# Altium footprint library HamedLib.PcbLib: 221 footprints (part 12 of 14)
Each footprint in its own frame and in the unit in brackets; x right, y up, seen from the top. Pads: shape width x height; smd on the part's side, far side on the other; paste and mask are expansions set on the pad; w line width, h text height; cw(c..) or ccw(c..) is an arc to the next point about the centre after c.
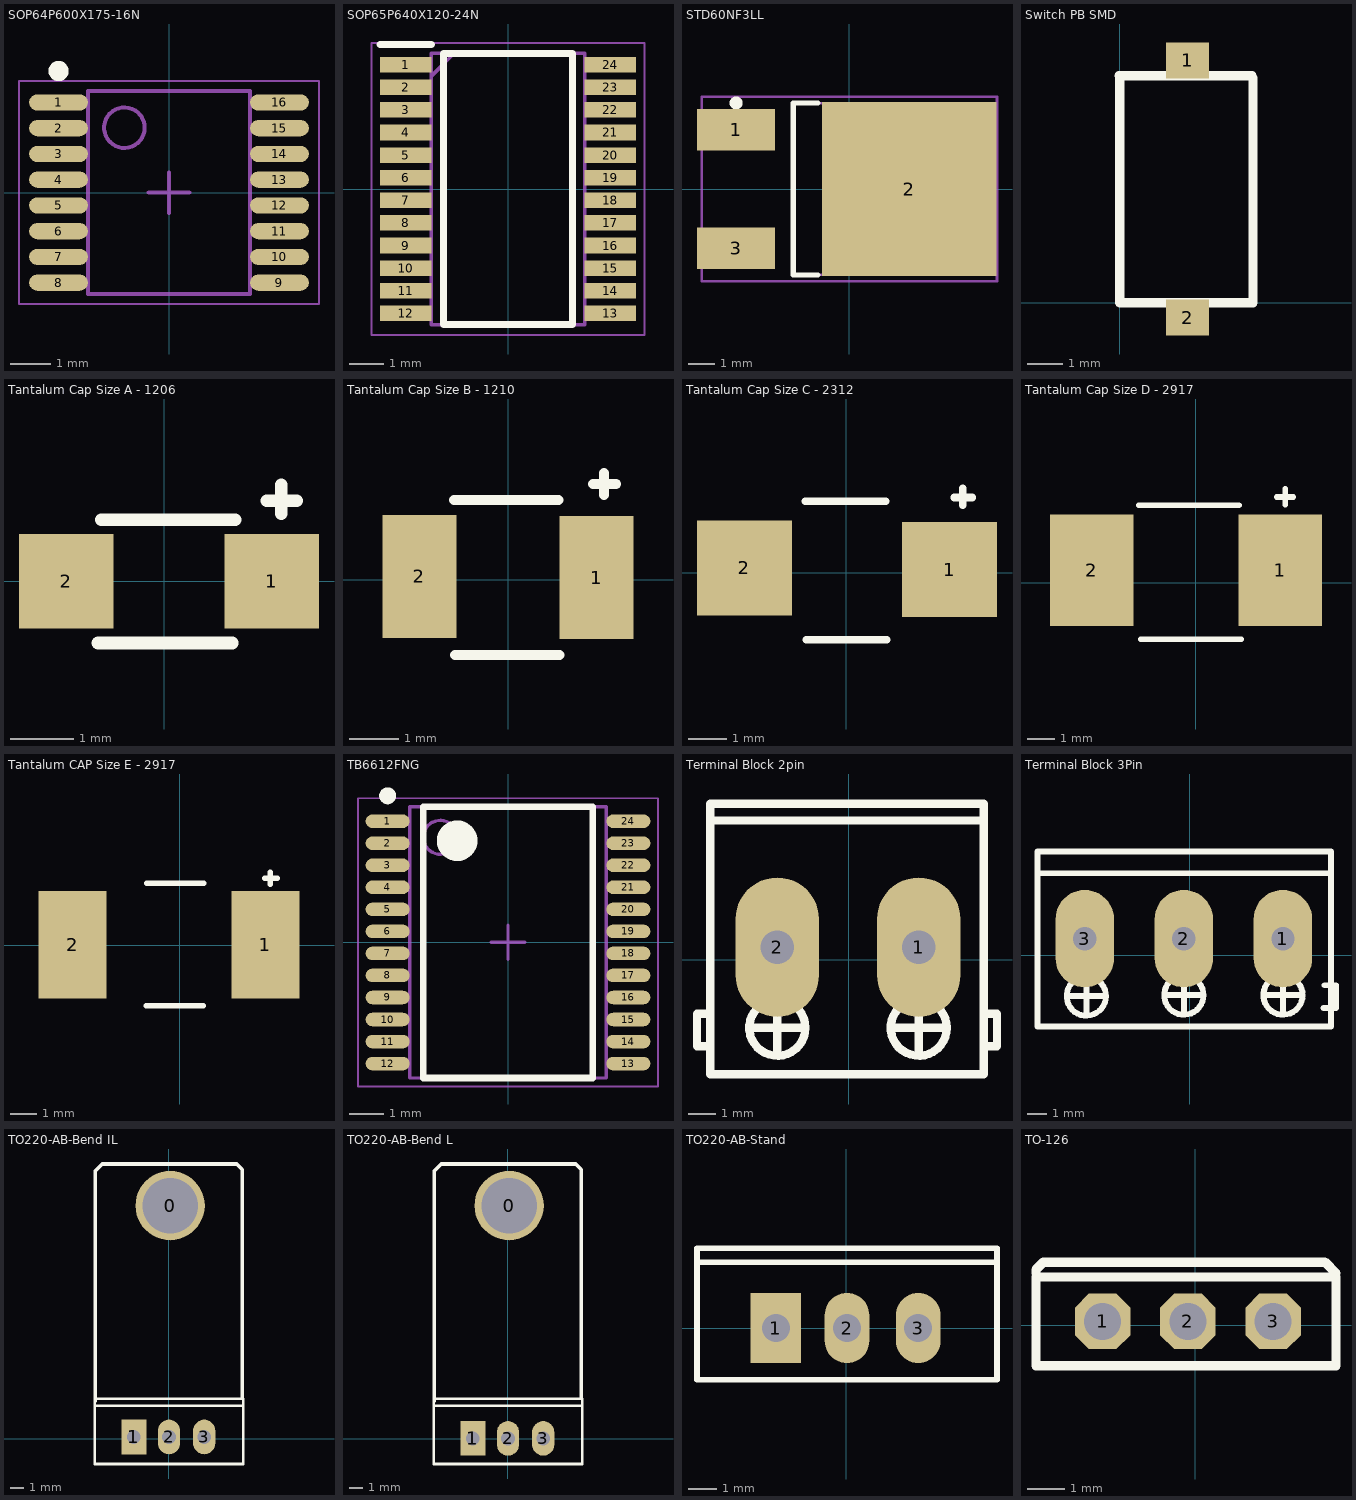
[diagram p11: the footprints below, top view; thin cyan lines are the x and y axes]

## SOP64P600X175-16N [mm] "SOP, 16-Leads, Body 4.90x3.90mm, Pitch 0.64mm, IPC Medium Density"
height 1.75
pads (16):
  oval 1.45x0.4 smd: 1(-2.725,2.222) 2(-2.725,1.587) 3(-2.725,0.953) 4(-2.725,0.318) 5(-2.725,-0.318) 6(-2.725,-0.953) 7(-2.725,-1.587) 8(-2.725,-2.222) 9(2.725,-2.222) 10(2.725,-1.587) 11(2.725,-0.953) 12(2.725,-0.318) 13(2.725,0.318) 14(2.725,0.953) 15(2.725,1.587) 16(2.725,2.222)
Top Overlay:
  circle w0.25: c-2.725,2.997 r0.125
Mechanical 13:
  circle w0.1: c-1.1,1.6 r0.5
  lines w0.1: -2,-2.5 2,-2.5 2,2.5 -2,2.5 -2,-2.5
Mechanical 15:
  lines w0.05: -3.7,-2.75 3.7,-2.75 3.7,2.75 -3.7,2.75 -3.7,-2.75
  lines w0.1: -0.5,0 0.5,0 ; 0,-0.5 0,0.5
3D body "User Library-MAX_QSOP16.step": height 1.71, standoff -0.06, extent -3.01,-2.49 3.01,2.49

## SOP65P640X120-24N [mm]
pads (24):
  rect 1.475x0.45 smd: 1(-2.938,3.575) 2(-2.938,2.925) 3(-2.938,2.275) 4(-2.938,1.625) 5(-2.938,0.975) 6(-2.938,0.325) 7(-2.938,-0.325) 8(-2.938,-0.975) 9(-2.938,-1.625) 10(-2.938,-2.275) 11(-2.938,-2.925) 12(-2.938,-3.575) 13(2.938,-3.575) 14(2.938,-2.925) 15(2.938,-2.275) 16(2.938,-1.625) 17(2.938,-0.975) 18(2.938,-0.325) 19(2.938,0.325) 20(2.938,0.975) 21(2.938,1.625) 22(2.938,2.275) 23(2.938,2.925) 24(2.938,3.575)
Top Overlay:
  lines w0.2: -3.675,4.15 -2.2,4.15 ; -1.85,-3.9 -1.85,3.9 1.85,3.9 1.85,-3.9 -1.85,-3.9
Mechanical 15:
  lines w0.1: -2.2,3.25 -1.55,3.9 ; -2.2,-3.9 -2.2,3.9 2.2,3.9 2.2,-3.9 -2.2,-3.9
Mechanical 20:
  lines w0.05: -3.925,-4.2 -3.925,4.2 3.925,4.2 3.925,-4.2 -3.925,-4.2

## STD60NF3LL [mm] "D-PAK, 3-Pads, Body 6.2x6.6mm (max), IPC Medium Density"
height 2.4
pads (3):
  rect 3x1.6 smd: 1(-4.35,2.28) 3(-4.35,-2.28)
  rect 6.7x6.7 smd: 2(2.3,0)
Top Overlay:
  circle w0.25: c-4.35,3.305 r0.125
  lines w0.2: -1.2,-3.3 -2.15,-3.3 -2.15,3.3 -1.2,3.3
Mechanical 13:
  lines w0.1: -2.15,-3.3 -2.15,3.3 4.05,3.3 4.05,-3.3 -2.15,-3.3
Mechanical 15:
  lines w0.1: -0.5,0 0.5,0 ; 0,-0.5 0,0.5 ; -5.675,-3.55 -5.675,3.55 5.675,3.55 5.675,-3.55 -5.675,-3.55
3D body "User Library-TO252AA.STEP": height 2.3, standoff -0.01, extent -4.77,-3.31 4.93,3.27

## Switch PB SMD [mm]
height 2.5
pads (2):
  rect 1.2x1 smd: 1(1.9,6.785) 2(1.9,-0.415)
Top Overlay:
  lines w0.254: -0.025,6.355 3.705,6.355 ; 0,6.29 0,0 3.73,0 ; 3.735,0 3.735,6.29
3D body "PushSwitchSMD.STEP": height 1.9, standoff -0.2, extent -0.1,-0.566 3.8,7.016

## Tantalum Cap Size A - 1206 [mm] "Tantalum Cap Size A - 1206"
pads (2):
  rect 1.5x1.5 smd: 1(1.7,0) 2(-1.55,0)
Top Overlay:
  lines w0.2: -1.05,-0.975 1.075,-0.975 ; -1,0.975 1.125,0.975 ; 1.625,1.275 2.1,1.275 ; 1.85,1.075 1.85,1.525
3D body "User Library-AVX_A_CASE.step": height 1.71, standoff 0, extent -1.65,-0.84 1.75,0.84

## Tantalum Cap Size B - 1210 [mm] "Tantalum Cap Size B - 1210"
pads (2):
  rect 1.5x2.5 smd: 1(1.8,0.05) 2(-1.8,0.075)
Top Overlay:
  lines w0.2: -1.1,1.625 1.025,1.625 ; -1.075,-1.525 1.05,-1.525 ; 1.725,1.95 2.2,1.95 ; 1.95,1.725 1.95,2.175
3D body "User Library-AVX_B_CASE.step": height 2.03, standoff 0, extent -1.8,-1.415 1.9,1.515

## Tantalum Cap Size C - 2312 [mm] "Tantalum Cap Size C - 2312"
pads (2):
  rect 2.5x2.5 smd: 1(2.725,0.075) 2(-2.675,0.125)
Top Overlay:
  lines w0.2: -1.075,1.875 1.05,1.875 ; -1.05,-1.775 1.075,-1.775 ; 2.85,1.975 3.325,1.975 ; 3.075,1.775 3.075,2.225
3D body "User Library-AVX_C_CASE.step": height 2.7, standoff 0, extent -3,-1.625 3.1,1.725

## Tantalum Cap Size D - 2917 [mm] "Tantalum 10uf,35v"
pads (2):
  rect 3x4 smd: 1(3.025,0.45) 2(-3.725,0.45)
Top Overlay:
  lines w0.2: -2.05,2.775 1.55,2.775 ; -1.975,-2.025 1.625,-2.025 ; 2.9,3.075 3.5,3.075 ; 3.2,2.8 3.2,3.375
3D body "User Library-AVX_D_CASE.step": height 3.01, standoff 0, extent -3.976,-1.85 3.425,2.6

## Tantalum CAP Size E - 2917 [mm]
pads (2):
  rect 2.54x4 smd: 1(3.2,0.025) 2(-4,0.025)
Top Overlay:
  lines w0.2: -1.25,-2.25 0.875,-2.25 ; -1.225,2.325 0.9,2.325 ; 3.175,2.5 3.65,2.5 ; 3.375,2.275 3.375,2.725
3D body "User Library-AVX_E_CASE.step": height 4.2, standoff 0, extent -4.051,-2.2 3.35,2.25

## TB6612FNG [mm] "SOP127P600-8N"
height 1.6
pads (24):
  oval 1.3x0.4 smd: 1(-3.55,3.575) 2(-3.55,2.925) 3(-3.55,2.275) 4(-3.55,1.625) 5(-3.55,0.975) 6(-3.55,0.325) 7(-3.55,-0.325) 8(-3.55,-0.975) 9(-3.55,-1.625) 10(-3.55,-2.275) 11(-3.55,-2.925) 12(-3.55,-3.575) 13(3.55,-3.575) 14(3.55,-2.925) 15(3.55,-2.275) 16(3.55,-1.625) 17(3.55,-0.975) 18(3.55,-0.325) 19(3.55,0.325) 20(3.55,0.975) 21(3.55,1.625) 22(3.55,2.275) 23(3.55,2.925) 24(3.55,3.575)
Top Overlay:
  circle w0.6: c-1.5,3 r0.3
  circle w0.25: c-3.55,4.325 r0.125
  lines w0.2: -2.5,-4 2.5,-4 2.5,4 -2.5,4 -2.5,-4
Mechanical 13:
  circle w0.1: c-2,3.1 r0.5
  lines w0.1: -2.9,-4 2.9,-4 2.9,4 -2.9,4 -2.9,-4
Mechanical 15:
  lines w0.05: -4.425,-4.25 4.425,-4.25 4.425,4.25 -4.425,4.25 -4.425,-4.25
  lines w0.1: -0.5,0 0.5,0 ; 0,-0.5 0,0.5
3D body "TB6612FNG.step": height 1.6, standoff 0, extent -3.725,-4 3.725,4

## Terminal Block 2pin [mm]
pads (2):
  oval 3x5 hole 1.2: 1(2.515,0.457) 2(-2.565,0.457)
Top Overlay:
  circle w0.3: c-2.565,-2.438 r1.006
  circle w0.3: c2.515,-2.438 r1.006
  lines w0.3: -5.1,-3.099 -5.45,-3.099 -5.45,-1.93 -5.025,-1.93 ; -4.9,5 4.8,5.01 ; -3.429,-2.438 -1.727,-2.438 ; -2.565,-3.277 -2.565,-1.651 ; 1.651,-2.438 3.353,-2.438 ; 2.515,-3.277 2.515,-1.651 ; 4.95,-3.099 5.325,-3.099 5.325,-1.93 4.95,-1.93
  lines w0.305: -4.975,-4.1 4.85,-4.1 4.85,5.6 -4.975,5.6 -4.975,-4.1
3D body "User Library-2 Way PCB Screw Terminal Block 5_08mm (1).step": height 15.2, standoff -3.5, extent -5.16,-4 5,5

## Terminal Block 3Pin [mm]
pads (3):
  oval 3x5 hole 1.2: 1(4.79,0.857) 2(-0.29,0.857) 3(-5.37,0.857)
Top Overlay:
  circle w0.3: c-0.29,-2.038 r1.006
  circle w0.3: c4.79,-2.038 r1.006
  circle w0.3: c-5.29,-2.088 r1.006
  lines w0.3: -7.75,4.21 7.2,4.21 ; -6.154,-2.088 -4.452,-2.088 ; -5.29,-2.927 -5.29,-1.301 ; -1.154,-2.038 0.548,-2.038 ; -0.29,-2.877 -0.29,-1.251 ; 3.926,-2.038 5.628,-2.038 ; 4.79,-2.877 4.79,-1.251 ; 6.872,-2.699 7.507,-2.699 7.507,-1.53 6.923,-1.53
  lines w0.305: -7.8,-3.65 7.25,-3.65 7.25,5.325 -7.8,5.325 -7.8,-3.65
3D body "User Library-3 Way PCB Screw Terminal Block 5mm.step": height 15.2, standoff -3.5, extent -7.725,-3.675 7.275,5.325

## TO220-AB-Bend IL [mm]
pads (4):
  round 5 hole 4: 0(0.1,16.8)
  rect 1.8x2.5 hole 1: 1(-2.521,0.116)
  oval 1.6x2.5 hole 1: 2(0.019,0.116) 3(2.559,0.116)
Top Overlay:
  circle w0.254: c0,16.9 r2
  lines w0.2: -5.331,2.366 5.369,2.366 ; -5.331,-1.834 -5.331,2.866 5.369,2.866 5.369,-1.834 -5.331,-1.834
  lines w0.254: -5.3,2.7 -5.3,19.3 -4.8,19.8 4.9,19.8 5.3,19.4 5.3,2.9
3D body "User Library-TO220 L.step": height 3.2, standoff -5, extent -5,0.148 5,19.852

## TO220-AB-Bend L [mm]
pads (4):
  round 5 hole 4: 0(0.1,16.8)
  rect 1.8x2.5 hole 1: 1(-2.521,0.016)
  oval 1.6x2.5 hole 1: 2(0.019,0.016) 3(2.559,0.016)
Top Overlay:
  circle w0.254: c0,16.9 r2
  lines w0.2: -5.331,2.366 5.369,2.366 ; -5.331,-1.834 -5.331,2.866 5.369,2.866 5.369,-1.834 -5.331,-1.834
  lines w0.254: -5.3,2.7 -5.3,19.3 -4.8,19.8 4.9,19.8 5.3,19.4 5.3,2.9
3D body "User Library-TO220-AB-H PCB.step": height 4.55, standoff -3.58, extent -4.9,-0.106 5,20.106

## TO220-AB-Stand [mm]
pads (3):
  rect 1.8x2.5 hole 1: 1(-2.521,0.016)
  oval 1.6x2.5 hole 1: 2(0.019,0.016) 3(2.559,0.016)
Top Overlay:
  lines w0.2: -5.331,2.366 5.369,2.366 ; -5.331,-1.834 -5.331,2.866 5.369,2.866 5.369,-1.834 -5.331,-1.834
3D body "User Library-TO-220AB.STEP": height 20.86, standoff -3, extent -5.3,-2 5.37,2.83

## TO-126 [mm]
pads (3):
  oct 1.5x1.5 hole 1: 1(-2.5,0.1) 2(-0.2,0.1) 3(2.1,0.1)
Top Overlay:
  lines w0.254: -4.3,1.4 -4.3,1.5 -4.1,1.7 3.5,1.7 3.8,1.4 ; -4.3,-1.1 -4.3,1.3 3.8,1.3 3.8,-1.1 -4.3,-1.1
3D body "User Library-2SB649A (TO-126 MOD) v3.step": height 14, standoff -3, extent -4.2,-1.1 3.8,1.6